# Altium schematic symbol library jlcpcb_2025_04_capacitors_extended_0402.schlib: 3594 symbols (part 9 of 20) (continued)
## CC0402KRX7R9BB332
designator C?  Capacitance: 3.3nF  (hidden comment: *)
Capacitor, Ceramic (MLCC), 3.3nF, ±10%, 50V, X7R, ±10%, SMD 0402; Manufacturer: YAGEO; Manufacturer Part Number: CC0402KRX7R9BB332; Package Size: 0402; JLCPCB Basic Part: No; JLCPCB Part Number: C107028; Supplier 1: LCSC; Category: Capacitors - MLCC; Supplier Part Number 1: C107028; Tolerance: ±10%; Voltage Rating: 50V; Temperature Coefficient: X7R; RoHS: Yes; ComponentLink1Description: Datasheet; ComponentLink1URL: https://wmsc.lcsc.com/wmsc/upload/file/pdf/v2/lcsc/2304140030_YAGEO-CC0402KRX7R9BB332_C107028.pdf; ComponentLink2Description: JLCPCB Part URL; ComponentLink2URL: https://jlcpcb.com/partdetail/C107028; ComponentLink3Description: LCSC Part URL; ComponentLink3URL: https://lcsc.com/product-detail/Multilayer-Ceramic-Capacitors-MLCC---SMD-SMT_YAGEO-YAGEO-CC0402KRX7R9BB332_C107028.html
footprint CAP-0402 (0402 (1005M) Capacitor)
pins: 1, 2

## CC0402KRX7R9BB333
designator C?  Capacitance: 33nF  (hidden comment: *)
Capacitor, Ceramic (MLCC), 33nF, ±10%, 50V, X7R, ±10%, SMD 0402; Manufacturer: YAGEO; Manufacturer Part Number: CC0402KRX7R9BB333; Package Size: 0402; JLCPCB Basic Part: No; JLCPCB Part Number: C106862; Supplier 1: LCSC; Category: Capacitors - MLCC; Supplier Part Number 1: C106862; Tolerance: ±10%; Voltage Rating: 50V; Temperature Coefficient: X7R; RoHS: Yes; ComponentLink1Description: Datasheet; ComponentLink1URL: https://wmsc.lcsc.com/wmsc/upload/file/pdf/v2/lcsc/2304140030_YAGEO-CC0402KRX7R9BB333_C106862.pdf; ComponentLink2Description: JLCPCB Part URL; ComponentLink2URL: https://jlcpcb.com/partdetail/C106862; ComponentLink3Description: LCSC Part URL; ComponentLink3URL: https://lcsc.com/product-detail/Multilayer-Ceramic-Capacitors-MLCC---SMD-SMT_YAGEO-YAGEO-CC0402KRX7R9BB333_C106862.html
footprint CAP-0402 (0402 (1005M) Capacitor)
pins: 1, 2

## CC0402KRX7R9BB391
designator C?  Capacitance: 390pF  (hidden comment: *)
Capacitor, Ceramic (MLCC), 390pF, ±10%, 50V, X7R, ±10%, SMD 0402; Manufacturer: YAGEO; Manufacturer Part Number: CC0402KRX7R9BB391; Package Size: 0402; JLCPCB Basic Part: No; JLCPCB Part Number: C114397; Supplier 1: LCSC; Category: Capacitors - MLCC; Supplier Part Number 1: C114397; Tolerance: ±10%; Voltage Rating: 50V; Temperature Coefficient: X7R; RoHS: Yes; ComponentLink1Description: Datasheet; ComponentLink1URL: https://wmsc.lcsc.com/wmsc/upload/file/pdf/v2/lcsc/2304140030_YAGEO-CC0402KRX7R9BB391_C114397.pdf; ComponentLink2Description: JLCPCB Part URL; ComponentLink2URL: https://jlcpcb.com/partdetail/C114397; ComponentLink3Description: LCSC Part URL; ComponentLink3URL: https://lcsc.com/product-detail/Multilayer-Ceramic-Capacitors-MLCC---SMD-SMT_YAGEO-YAGEO-CC0402KRX7R9BB391_C114397.html
footprint CAP-0402 (0402 (1005M) Capacitor)
pins: 1, 2

## CC0402KRX7R9BB392
designator C?  Capacitance: 3.9nF  (hidden comment: *)
Capacitor, Ceramic (MLCC), 3.9nF, ±10%, 50V, X7R, ±10%, SMD 0402; Manufacturer: YAGEO; Manufacturer Part Number: CC0402KRX7R9BB392; Package Size: 0402; JLCPCB Basic Part: No; JLCPCB Part Number: C113790; Supplier 1: LCSC; Category: Capacitors - MLCC; Supplier Part Number 1: C113790; Tolerance: ±10%; Voltage Rating: 50V; Temperature Coefficient: X7R; RoHS: Yes; ComponentLink1Description: Datasheet; ComponentLink1URL: https://wmsc.lcsc.com/wmsc/upload/file/pdf/v2/lcsc/2304140030_YAGEO-CC0402KRX7R9BB392_C113790.pdf; ComponentLink2Description: JLCPCB Part URL; ComponentLink2URL: https://jlcpcb.com/partdetail/C113790; ComponentLink3Description: LCSC Part URL; ComponentLink3URL: https://lcsc.com/product-detail/Multilayer-Ceramic-Capacitors-MLCC---SMD-SMT_YAGEO-YAGEO-CC0402KRX7R9BB392_C113790.html
footprint CAP-0402 (0402 (1005M) Capacitor)
pins: 1, 2

## CC0402KRX7R9BB471
designator C?  Capacitance: 470pF  (hidden comment: *)
Capacitor, Ceramic (MLCC), 470pF, ±10%, 50V, X7R, ±10%, SMD 0402; Manufacturer: YAGEO; Manufacturer Part Number: CC0402KRX7R9BB471; Package Size: 0402; JLCPCB Basic Part: No; JLCPCB Part Number: C106207; Supplier 1: LCSC; Category: Capacitors - MLCC; Supplier Part Number 1: C106207; Tolerance: ±10%; Voltage Rating: 50V; Temperature Coefficient: X7R; RoHS: Yes; ComponentLink1Description: Datasheet; ComponentLink1URL: https://wmsc.lcsc.com/wmsc/upload/file/pdf/v2/lcsc/2304140030_YAGEO-CC0402KRX7R9BB471_C106207.pdf; ComponentLink2Description: JLCPCB Part URL; ComponentLink2URL: https://jlcpcb.com/partdetail/C106207; ComponentLink3Description: LCSC Part URL; ComponentLink3URL: https://lcsc.com/product-detail/Multilayer-Ceramic-Capacitors-MLCC---SMD-SMT_YAGEO-YAGEO-CC0402KRX7R9BB471_C106207.html
footprint CAP-0402 (0402 (1005M) Capacitor)
pins: 1, 2

## CC0402KRX7R9BB472
designator C?  Capacitance: 4.7nF  (hidden comment: *)
Capacitor, Ceramic (MLCC), 4.7nF, ±10%, 50V, X7R, ±10%, SMD 0402; Manufacturer: YAGEO; Manufacturer Part Number: CC0402KRX7R9BB472; Package Size: 0402; JLCPCB Basic Part: No; JLCPCB Part Number: C106208; Supplier 1: LCSC; Category: Capacitors - MLCC; Supplier Part Number 1: C106208; Tolerance: ±10%; Voltage Rating: 50V; Temperature Coefficient: X7R; RoHS: Yes; ComponentLink1Description: Datasheet; ComponentLink1URL: https://wmsc.lcsc.com/wmsc/upload/file/pdf/v2/lcsc/2304140030_YAGEO-CC0402KRX7R9BB472_C106208.pdf; ComponentLink2Description: JLCPCB Part URL; ComponentLink2URL: https://jlcpcb.com/partdetail/C106208; ComponentLink3Description: LCSC Part URL; ComponentLink3URL: https://lcsc.com/product-detail/Multilayer-Ceramic-Capacitors-MLCC---SMD-SMT_YAGEO-YAGEO-CC0402KRX7R9BB472_C106208.html
footprint CAP-0402 (0402 (1005M) Capacitor)
pins: 1, 2

## CC0402KRX7R9BB473
designator C?  Capacitance: 47nF  (hidden comment: *)
Capacitor, Ceramic (MLCC), 47nF, ±10%, 50V, X7R, ±10%, SMD 0402; Manufacturer: YAGEO; Manufacturer Part Number: CC0402KRX7R9BB473; Package Size: 0402; JLCPCB Basic Part: No; JLCPCB Part Number: C272875; Supplier 1: LCSC; Category: Capacitors - MLCC; Supplier Part Number 1: C272875; Tolerance: ±10%; Voltage Rating: 50V; Temperature Coefficient: X7R; RoHS: Yes; ComponentLink1Description: Datasheet; ComponentLink1URL: https://wmsc.lcsc.com/wmsc/upload/file/pdf/v2/lcsc/2304140030_YAGEO-CC0402KRX7R9BB473_C272875.pdf; ComponentLink2Description: JLCPCB Part URL; ComponentLink2URL: https://jlcpcb.com/partdetail/C272875; ComponentLink3Description: LCSC Part URL; ComponentLink3URL: https://lcsc.com/product-detail/Multilayer-Ceramic-Capacitors-MLCC---SMD-SMT_YAGEO-YAGEO-CC0402KRX7R9BB473_C272875.html
footprint CAP-0402 (0402 (1005M) Capacitor)
pins: 1, 2

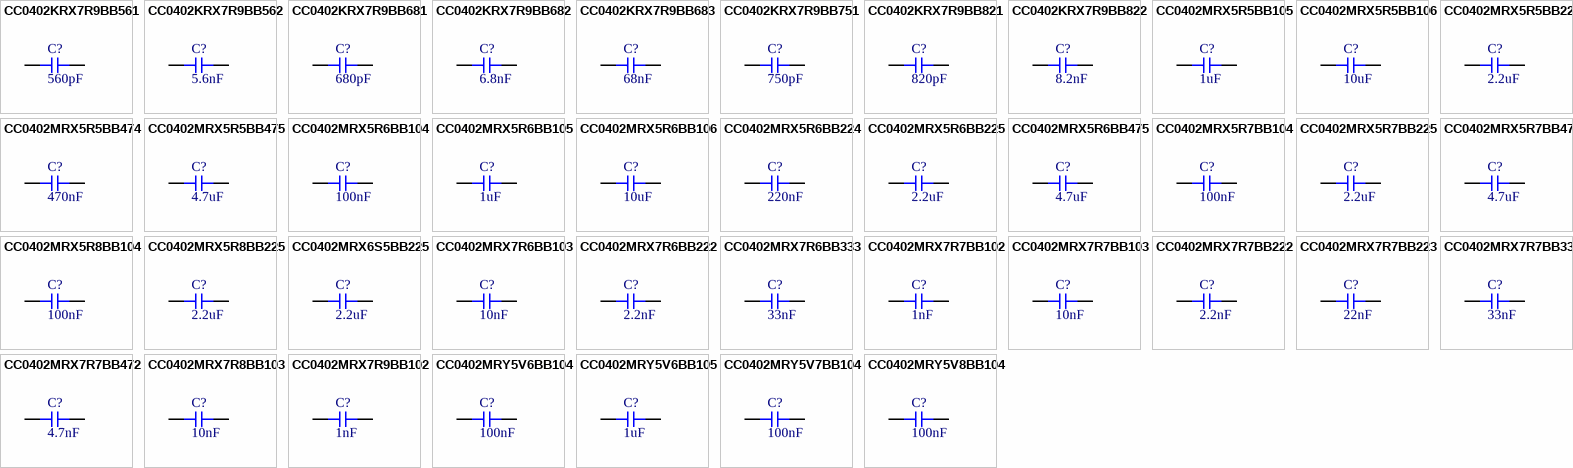
[diagram p41: symbols CC0402KRX7R9BB561 to CC0402MRY5V8BB104]

## CC0402KRX7R9BB561
designator C?  Capacitance: 560pF  (hidden comment: *)
Capacitor, Ceramic (MLCC), 560pF, ±10%, 50V, X7R, ±10%, SMD 0402; Manufacturer: YAGEO; Manufacturer Part Number: CC0402KRX7R9BB561; Package Size: 0402; JLCPCB Basic Part: No; JLCPCB Part Number: C107029; Supplier 1: LCSC; Category: Capacitors - MLCC; Supplier Part Number 1: C107029; Tolerance: ±10%; Voltage Rating: 50V; Temperature Coefficient: X7R; RoHS: Yes; ComponentLink1Description: Datasheet; ComponentLink1URL: https://wmsc.lcsc.com/wmsc/upload/file/pdf/v2/lcsc/2304140030_YAGEO-CC0402KRX7R9BB561_C107029.pdf; ComponentLink2Description: JLCPCB Part URL; ComponentLink2URL: https://jlcpcb.com/partdetail/C107029; ComponentLink3Description: LCSC Part URL; ComponentLink3URL: https://lcsc.com/product-detail/Multilayer-Ceramic-Capacitors-MLCC---SMD-SMT_YAGEO-YAGEO-CC0402KRX7R9BB561_C107029.html
footprint CAP-0402 (0402 (1005M) Capacitor)
pins: 1, 2

## CC0402KRX7R9BB562
designator C?  Capacitance: 5.6nF  (hidden comment: *)
Capacitor, Ceramic (MLCC), 5.6nF, ±10%, 50V, X7R, ±10%, SMD 0402; Manufacturer: YAGEO; Manufacturer Part Number: CC0402KRX7R9BB562; Package Size: 0402; JLCPCB Basic Part: No; JLCPCB Part Number: C281760; Supplier 1: LCSC; Category: Capacitors - MLCC; Supplier Part Number 1: C281760; Tolerance: ±10%; Voltage Rating: 50V; Temperature Coefficient: X7R; RoHS: Yes; ComponentLink1Description: Datasheet; ComponentLink1URL: https://wmsc.lcsc.com/wmsc/upload/file/pdf/v2/lcsc/2304140030_YAGEO-CC0402KRX7R9BB562_C281760.pdf; ComponentLink2Description: JLCPCB Part URL; ComponentLink2URL: https://jlcpcb.com/partdetail/C281760; ComponentLink3Description: LCSC Part URL; ComponentLink3URL: https://lcsc.com/product-detail/Multilayer-Ceramic-Capacitors-MLCC---SMD-SMT_YAGEO-YAGEO-CC0402KRX7R9BB562_C281760.html
footprint CAP-0402 (0402 (1005M) Capacitor)
pins: 1, 2

## CC0402KRX7R9BB681
designator C?  Capacitance: 680pF  (hidden comment: *)
Capacitor, Ceramic (MLCC), 680pF, ±10%, 50V, X7R, ±10%, SMD 0402; Manufacturer: YAGEO; Manufacturer Part Number: CC0402KRX7R9BB681; Package Size: 0402; JLCPCB Basic Part: No; JLCPCB Part Number: C107030; Supplier 1: LCSC; Category: Capacitors - MLCC; Supplier Part Number 1: C107030; Tolerance: ±10%; Voltage Rating: 50V; Temperature Coefficient: X7R; RoHS: Yes; ComponentLink1Description: Datasheet; ComponentLink1URL: https://wmsc.lcsc.com/wmsc/upload/file/pdf/v2/lcsc/2304140030_YAGEO-CC0402KRX7R9BB681_C107030.pdf; ComponentLink2Description: JLCPCB Part URL; ComponentLink2URL: https://jlcpcb.com/partdetail/C107030; ComponentLink3Description: LCSC Part URL; ComponentLink3URL: https://lcsc.com/product-detail/Multilayer-Ceramic-Capacitors-MLCC---SMD-SMT_YAGEO-YAGEO-CC0402KRX7R9BB681_C107030.html
footprint CAP-0402 (0402 (1005M) Capacitor)
pins: 1, 2

## CC0402KRX7R9BB682
designator C?  Capacitance: 6.8nF  (hidden comment: *)
Capacitor, Ceramic (MLCC), 6.8nF, ±10%, 50V, X7R, ±10%, SMD 0402; Manufacturer: YAGEO; Manufacturer Part Number: CC0402KRX7R9BB682; Package Size: 0402; JLCPCB Basic Part: No; JLCPCB Part Number: C93654; Supplier 1: LCSC; Category: Capacitors - MLCC; Supplier Part Number 1: C93654; Tolerance: ±10%; Voltage Rating: 50V; Temperature Coefficient: X7R; RoHS: Yes; ComponentLink1Description: Datasheet; ComponentLink1URL: https://wmsc.lcsc.com/wmsc/upload/file/pdf/v2/lcsc/2304140030_YAGEO-CC0402KRX7R9BB682_C93654.pdf; ComponentLink2Description: JLCPCB Part URL; ComponentLink2URL: https://jlcpcb.com/partdetail/C93654; ComponentLink3Description: LCSC Part URL; ComponentLink3URL: https://lcsc.com/product-detail/Multilayer-Ceramic-Capacitors-MLCC---SMD-SMT_YAGEO-YAGEO-CC0402KRX7R9BB682_C93654.html
footprint CAP-0402 (0402 (1005M) Capacitor)
pins: 1, 2

## CC0402KRX7R9BB683
designator C?  Capacitance: 68nF  (hidden comment: *)
Capacitor, Ceramic (MLCC), 68nF, ±10%, 50V, X7R, ±10%, SMD 0402; Manufacturer: YAGEO; Manufacturer Part Number: CC0402KRX7R9BB683; Package Size: 0402; JLCPCB Basic Part: No; JLCPCB Part Number: C354977; Supplier 1: LCSC; Category: Capacitors - MLCC; Supplier Part Number 1: C354977; Tolerance: ±10%; Voltage Rating: 50V; Temperature Coefficient: X7R; RoHS: Yes; ComponentLink1Description: Datasheet; ComponentLink1URL: https://wmsc.lcsc.com/wmsc/upload/file/pdf/v2/lcsc/2311211121_YAGEO-CC0402KRX7R9BB683_C354977.pdf; ComponentLink2Description: JLCPCB Part URL; ComponentLink2URL: https://jlcpcb.com/partdetail/C354977; ComponentLink3Description: LCSC Part URL; ComponentLink3URL: https://lcsc.com/product-detail/Multilayer-Ceramic-Capacitors-MLCC---SMD-SMT_YAGEO-YAGEO-CC0402KRX7R9BB683_C354977.html
footprint CAP-0402 (0402 (1005M) Capacitor)
pins: 1, 2

## CC0402KRX7R9BB751
designator C?  Capacitance: 750pF  (hidden comment: *)
Capacitor, Ceramic (MLCC), 750pF, ±10%, 50V, X7R, ±10%, SMD 0402; Manufacturer: YAGEO; Manufacturer Part Number: CC0402KRX7R9BB751; Package Size: 0402; JLCPCB Basic Part: No; JLCPCB Part Number: C513563; Supplier 1: LCSC; Category: Capacitors - MLCC; Supplier Part Number 1: C513563; Tolerance: ±10%; Voltage Rating: 50V; Temperature Coefficient: X7R; RoHS: Yes; ComponentLink1Description: Datasheet; ComponentLink1URL: https://wmsc.lcsc.com/wmsc/upload/file/pdf/v2/lcsc/2204291600_YAGEO-CC0402KRX7R9BB751_C513563.pdf; ComponentLink2Description: JLCPCB Part URL; ComponentLink2URL: https://jlcpcb.com/partdetail/C513563; ComponentLink3Description: LCSC Part URL; ComponentLink3URL: https://lcsc.com/product-detail/Multilayer-Ceramic-Capacitors-MLCC---SMD-SMT_YAGEO-YAGEO-CC0402KRX7R9BB751_C513563.html
footprint CAP-0402 (0402 (1005M) Capacitor)
pins: 1, 2

## CC0402KRX7R9BB821
designator C?  Capacitance: 820pF  (hidden comment: *)
Capacitor, Ceramic (MLCC), 820pF, ±10%, 50V, X7R, ±10%, SMD 0402; Manufacturer: YAGEO; Manufacturer Part Number: CC0402KRX7R9BB821; Package Size: 0402; JLCPCB Basic Part: No; JLCPCB Part Number: C107031; Supplier 1: LCSC; Category: Capacitors - MLCC; Supplier Part Number 1: C107031; Tolerance: ±10%; Voltage Rating: 50V; Temperature Coefficient: X7R; RoHS: Yes; ComponentLink1Description: Datasheet; ComponentLink1URL: https://wmsc.lcsc.com/wmsc/upload/file/pdf/v2/lcsc/2008031703_YAGEO-CC0402KRX7R9BB821_C107031.pdf; ComponentLink2Description: JLCPCB Part URL; ComponentLink2URL: https://jlcpcb.com/partdetail/C107031; ComponentLink3Description: LCSC Part URL; ComponentLink3URL: https://lcsc.com/product-detail/Multilayer-Ceramic-Capacitors-MLCC---SMD-SMT_YAGEO-YAGEO-CC0402KRX7R9BB821_C107031.html
footprint CAP-0402 (0402 (1005M) Capacitor)
pins: 1, 2

## CC0402KRX7R9BB822
designator C?  Capacitance: 8.2nF  (hidden comment: *)
Capacitor, Ceramic (MLCC), 8.2nF, ±10%, 50V, X7R, ±10%, SMD 0402; Manufacturer: YAGEO; Manufacturer Part Number: CC0402KRX7R9BB822; Package Size: 0402; JLCPCB Basic Part: No; JLCPCB Part Number: C107032; Supplier 1: LCSC; Category: Capacitors - MLCC; Supplier Part Number 1: C107032; Tolerance: ±10%; Voltage Rating: 50V; Temperature Coefficient: X7R; RoHS: Yes; ComponentLink1Description: Datasheet; ComponentLink1URL: https://wmsc.lcsc.com/wmsc/upload/file/pdf/v2/lcsc/2304140030_YAGEO-CC0402KRX7R9BB822_C107032.pdf; ComponentLink2Description: JLCPCB Part URL; ComponentLink2URL: https://jlcpcb.com/partdetail/C107032; ComponentLink3Description: LCSC Part URL; ComponentLink3URL: https://lcsc.com/product-detail/Multilayer-Ceramic-Capacitors-MLCC---SMD-SMT_YAGEO-YAGEO-CC0402KRX7R9BB822_C107032.html
footprint CAP-0402 (0402 (1005M) Capacitor)
pins: 1, 2

## CC0402MRX5R5BB105
designator C?  Capacitance: 1uF  (hidden comment: *)
Capacitor, Ceramic (MLCC), 1uF, ±20%, 6.3V, X5R, ±20%, SMD 0402; Manufacturer: YAGEO; Manufacturer Part Number: CC0402MRX5R5BB105; Package Size: 0402; JLCPCB Basic Part: No; JLCPCB Part Number: C541408; Supplier 1: LCSC; Category: Capacitors - MLCC; Supplier Part Number 1: C541408; Tolerance: ±20%; Voltage Rating: 6.3V; Temperature Coefficient: X5R; RoHS: Yes; ComponentLink1Description: Datasheet; ComponentLink1URL: https://wmsc.lcsc.com/wmsc/upload/file/pdf/v2/lcsc/2407081117_YAGEO-CC0402MRX5R5BB105_C541408.pdf; ComponentLink2Description: JLCPCB Part URL; ComponentLink2URL: https://jlcpcb.com/partdetail/C541408; ComponentLink3Description: LCSC Part URL; ComponentLink3URL: https://lcsc.com/product-detail/Multilayer-Ceramic-Capacitors-MLCC---SMD-SMT_YAGEO-YAGEO-CC0402MRX5R5BB105_C541408.html
footprint CAP-0402 (0402 (1005M) Capacitor)
pins: 1, 2

## CC0402MRX5R5BB106
designator C?  Capacitance: 10uF  (hidden comment: *)
Capacitor, Ceramic (MLCC), 10uF, ±20%, 6.3V, X5R, ±20%, SMD 0402; Manufacturer: YAGEO; Manufacturer Part Number: CC0402MRX5R5BB106; Package Size: 0402; JLCPCB Basic Part: No; JLCPCB Part Number: C105884; Supplier 1: LCSC; Category: Capacitors - MLCC; Supplier Part Number 1: C105884; Tolerance: ±20%; Voltage Rating: 6.3V; Temperature Coefficient: X5R; RoHS: Yes; ComponentLink1Description: Datasheet; ComponentLink1URL: https://wmsc.lcsc.com/wmsc/upload/file/pdf/v2/lcsc/2407081117_YAGEO-CC0402MRX5R5BB106_C105884.pdf; ComponentLink2Description: JLCPCB Part URL; ComponentLink2URL: https://jlcpcb.com/partdetail/C105884; ComponentLink3Description: LCSC Part URL; ComponentLink3URL: https://lcsc.com/product-detail/Multilayer-Ceramic-Capacitors-MLCC---SMD-SMT_YAGEO-YAGEO-CC0402MRX5R5BB106_C105884.html
footprint CAP-0402 (0402 (1005M) Capacitor)
pins: 1, 2

## CC0402MRX5R5BB225
designator C?  Capacitance: 2.2uF  (hidden comment: *)
Capacitor, Ceramic (MLCC), 2.2uF, ±20%, 6.3V, X5R, ±20%, SMD 0402; Manufacturer: YAGEO; Manufacturer Part Number: CC0402MRX5R5BB225; Package Size: 0402; JLCPCB Basic Part: No; JLCPCB Part Number: C106860; Supplier 1: LCSC; Category: Capacitors - MLCC; Supplier Part Number 1: C106860; Tolerance: ±20%; Voltage Rating: 6.3V; Temperature Coefficient: X5R; RoHS: Yes; ComponentLink1Description: Datasheet; ComponentLink1URL: https://wmsc.lcsc.com/wmsc/upload/file/pdf/v2/lcsc/2407081117_YAGEO-CC0402MRX5R5BB225_C106860.pdf; ComponentLink2Description: JLCPCB Part URL; ComponentLink2URL: https://jlcpcb.com/partdetail/C106860; ComponentLink3Description: LCSC Part URL; ComponentLink3URL: https://lcsc.com/product-detail/Multilayer-Ceramic-Capacitors-MLCC---SMD-SMT_YAGEO-YAGEO-CC0402MRX5R5BB225_C106860.html
footprint CAP-0402 (0402 (1005M) Capacitor)
pins: 1, 2

## CC0402MRX5R5BB474
designator C?  Capacitance: 470nF  (hidden comment: *)
Capacitor, Ceramic (MLCC), 470nF, ±20%, 6.3V, X5R, ±20%, SMD 0402; Manufacturer: YAGEO; Manufacturer Part Number: CC0402MRX5R5BB474; Package Size: 0402; JLCPCB Basic Part: No; JLCPCB Part Number: C469626; Supplier 1: LCSC; Category: Capacitors - MLCC; Supplier Part Number 1: C469626; Tolerance: ±20%; Voltage Rating: 6.3V; Temperature Coefficient: X5R; RoHS: Yes; ComponentLink1Description: Datasheet; ComponentLink1URL: https://wmsc.lcsc.com/wmsc/upload/file/pdf/v2/lcsc/2407081117_YAGEO-CC0402MRX5R5BB474_C469626.pdf; ComponentLink2Description: JLCPCB Part URL; ComponentLink2URL: https://jlcpcb.com/partdetail/C469626; ComponentLink3Description: LCSC Part URL; ComponentLink3URL: https://lcsc.com/product-detail/Multilayer-Ceramic-Capacitors-MLCC---SMD-SMT_YAGEO-YAGEO-CC0402MRX5R5BB474_C469626.html
footprint CAP-0402 (0402 (1005M) Capacitor)
pins: 1, 2

## CC0402MRX5R5BB475
designator C?  Capacitance: 4.7uF  (hidden comment: *)
Capacitor, Ceramic (MLCC), 4.7uF, ±20%, 6.3V, X5R, ±20%, SMD 0402; Manufacturer: YAGEO; Manufacturer Part Number: CC0402MRX5R5BB475; Package Size: 0402; JLCPCB Basic Part: No; JLCPCB Part Number: C106859; Supplier 1: LCSC; Category: Capacitors - MLCC; Supplier Part Number 1: C106859; Tolerance: ±20%; Voltage Rating: 6.3V; Temperature Coefficient: X5R; RoHS: Yes; ComponentLink1Description: Datasheet; ComponentLink1URL: https://wmsc.lcsc.com/wmsc/upload/file/pdf/v2/lcsc/2407081117_YAGEO-CC0402MRX5R5BB475_C106859.pdf; ComponentLink2Description: JLCPCB Part URL; ComponentLink2URL: https://jlcpcb.com/partdetail/C106859; ComponentLink3Description: LCSC Part URL; ComponentLink3URL: https://lcsc.com/product-detail/Multilayer-Ceramic-Capacitors-MLCC---SMD-SMT_YAGEO-YAGEO-CC0402MRX5R5BB475_C106859.html
footprint CAP-0402 (0402 (1005M) Capacitor)
pins: 1, 2

## CC0402MRX5R6BB104
designator C?  Capacitance: 100nF  (hidden comment: *)
Capacitor, Ceramic (MLCC), 100nF, ±20%, 10V, X5R, ±20%, SMD 0402; Manufacturer: YAGEO; Manufacturer Part Number: CC0402MRX5R6BB104; Package Size: 0402; JLCPCB Basic Part: No; JLCPCB Part Number: C2171572; Supplier 1: LCSC; Category: Capacitors - MLCC; Supplier Part Number 1: C2171572; Tolerance: ±20%; Voltage Rating: 10V; Temperature Coefficient: X5R; RoHS: Yes; ComponentLink1Description: Datasheet; ComponentLink1URL: https://wmsc.lcsc.com/wmsc/upload/file/pdf/v2/lcsc/2407081117_YAGEO-CC0402MRX5R6BB104_C2171572.pdf; ComponentLink2Description: JLCPCB Part URL; ComponentLink2URL: https://jlcpcb.com/partdetail/C2171572; ComponentLink3Description: LCSC Part URL; ComponentLink3URL: https://lcsc.com/product-detail/Multilayer-Ceramic-Capacitors-MLCC---SMD-SMT_YAGEO-YAGEO-CC0402MRX5R6BB104_C2171572.html
footprint CAP-0402 (0402 (1005M) Capacitor)
pins: 1, 2

## CC0402MRX5R6BB105
designator C?  Capacitance: 1uF  (hidden comment: *)
Capacitor, Ceramic (MLCC), 1uF, ±20%, 10V, X5R, ±20%, SMD 0402; Manufacturer: YAGEO; Manufacturer Part Number: CC0402MRX5R6BB105; Package Size: 0402; JLCPCB Basic Part: No; JLCPCB Part Number: C113791; Supplier 1: LCSC; Category: Capacitors - MLCC; Supplier Part Number 1: C113791; Tolerance: ±20%; Voltage Rating: 10V; Temperature Coefficient: X5R; RoHS: Yes; ComponentLink1Description: Datasheet; ComponentLink1URL: https://wmsc.lcsc.com/wmsc/upload/file/pdf/v2/lcsc/2407081117_YAGEO-CC0402MRX5R6BB105_C113791.pdf; ComponentLink2Description: JLCPCB Part URL; ComponentLink2URL: https://jlcpcb.com/partdetail/C113791; ComponentLink3Description: LCSC Part URL; ComponentLink3URL: https://lcsc.com/product-detail/Multilayer-Ceramic-Capacitors-MLCC---SMD-SMT_YAGEO-YAGEO-CC0402MRX5R6BB105_C113791.html
footprint CAP-0402 (0402 (1005M) Capacitor)
pins: 1, 2

## CC0402MRX5R6BB106
designator C?  Capacitance: 10uF  (hidden comment: *)
Capacitor, Ceramic (MLCC), 10uF, ±20%, 10V, X5R, ±20%, SMD 0402; Manufacturer: YAGEO; Manufacturer Part Number: CC0402MRX5R6BB106; Package Size: 0402; JLCPCB Basic Part: No; JLCPCB Part Number: C962143; Supplier 1: LCSC; Category: Capacitors - MLCC; Supplier Part Number 1: C962143; Tolerance: ±20%; Voltage Rating: 10V; Temperature Coefficient: X5R; RoHS: Yes; ComponentLink1Description: Datasheet; ComponentLink1URL: https://wmsc.lcsc.com/wmsc/upload/file/pdf/v2/lcsc/2407081117_YAGEO-CC0402MRX5R6BB106_C962143.pdf; ComponentLink2Description: JLCPCB Part URL; ComponentLink2URL: https://jlcpcb.com/partdetail/C962143; ComponentLink3Description: LCSC Part URL; ComponentLink3URL: https://lcsc.com/product-detail/Multilayer-Ceramic-Capacitors-MLCC---SMD-SMT_YAGEO-YAGEO-CC0402MRX5R6BB106_C962143.html
footprint CAP-0402 (0402 (1005M) Capacitor)
pins: 1, 2

## CC0402MRX5R6BB224
designator C?  Capacitance: 220nF  (hidden comment: *)
Capacitor, Ceramic (MLCC), 220nF, ±20%, 10V, X5R, ±20%, SMD 0402; Manufacturer: YAGEO; Manufacturer Part Number: CC0402MRX5R6BB224; Package Size: 0402; JLCPCB Basic Part: No; JLCPCB Part Number: C2188682; Supplier 1: LCSC; Category: Capacitors - MLCC; Supplier Part Number 1: C2188682; Tolerance: ±20%; Voltage Rating: 10V; Temperature Coefficient: X5R; RoHS: Yes; ComponentLink1Description: Datasheet; ComponentLink1URL: https://wmsc.lcsc.com/wmsc/upload/file/pdf/v2/lcsc/2407081117_YAGEO-CC0402MRX5R6BB224_C2188682.pdf; ComponentLink2Description: JLCPCB Part URL; ComponentLink2URL: https://jlcpcb.com/partdetail/C2188682; ComponentLink3Description: LCSC Part URL; ComponentLink3URL: https://lcsc.com/product-detail/Multilayer-Ceramic-Capacitors-MLCC---SMD-SMT_YAGEO-YAGEO-CC0402MRX5R6BB224_C2188682.html
footprint CAP-0402 (0402 (1005M) Capacitor)
pins: 1, 2

## CC0402MRX5R6BB225
designator C?  Capacitance: 2.2uF  (hidden comment: *)
Capacitor, Ceramic (MLCC), 2.2uF, ±20%, 10V, X5R, ±20%, SMD 0402; Manufacturer: YAGEO; Manufacturer Part Number: CC0402MRX5R6BB225; Package Size: 0402; JLCPCB Basic Part: No; JLCPCB Part Number: C541410; Supplier 1: LCSC; Category: Capacitors - MLCC; Supplier Part Number 1: C541410; Tolerance: ±20%; Voltage Rating: 10V; Temperature Coefficient: X5R; RoHS: Yes; ComponentLink1Description: Datasheet; ComponentLink1URL: https://wmsc.lcsc.com/wmsc/upload/file/pdf/v2/lcsc/2407081117_YAGEO-CC0402MRX5R6BB225_C541410.pdf; ComponentLink2Description: JLCPCB Part URL; ComponentLink2URL: https://jlcpcb.com/partdetail/C541410; ComponentLink3Description: LCSC Part URL; ComponentLink3URL: https://lcsc.com/product-detail/Multilayer-Ceramic-Capacitors-MLCC---SMD-SMT_YAGEO-YAGEO-CC0402MRX5R6BB225_C541410.html
footprint CAP-0402 (0402 (1005M) Capacitor)
pins: 1, 2

## CC0402MRX5R6BB475
designator C?  Capacitance: 4.7uF  (hidden comment: *)
Capacitor, Ceramic (MLCC), 4.7uF, ±20%, 10V, X5R, ±20%, SMD 0402; Manufacturer: YAGEO; Manufacturer Part Number: CC0402MRX5R6BB475; Package Size: 0402; JLCPCB Basic Part: No; JLCPCB Part Number: C469468; Supplier 1: LCSC; Category: Capacitors - MLCC; Supplier Part Number 1: C469468; Tolerance: ±20%; Voltage Rating: 10V; Temperature Coefficient: X5R; RoHS: Yes; ComponentLink1Description: Datasheet; ComponentLink1URL: https://wmsc.lcsc.com/wmsc/upload/file/pdf/v2/lcsc/2407081117_YAGEO-CC0402MRX5R6BB475_C469468.pdf; ComponentLink2Description: JLCPCB Part URL; ComponentLink2URL: https://jlcpcb.com/partdetail/C469468; ComponentLink3Description: LCSC Part URL; ComponentLink3URL: https://lcsc.com/product-detail/Multilayer-Ceramic-Capacitors-MLCC---SMD-SMT_YAGEO-YAGEO-CC0402MRX5R6BB475_C469468.html
footprint CAP-0402 (0402 (1005M) Capacitor)
pins: 1, 2

## CC0402MRX5R7BB104
designator C?  Capacitance: 100nF  (hidden comment: *)
Capacitor, Ceramic (MLCC), 100nF, ±20%, 16V, X5R, ±20%, SMD 0402; Manufacturer: YAGEO; Manufacturer Part Number: CC0402MRX5R7BB104; Package Size: 0402; JLCPCB Basic Part: No; JLCPCB Part Number: C576741; Supplier 1: LCSC; Category: Capacitors - MLCC; Supplier Part Number 1: C576741; Tolerance: ±20%; Voltage Rating: 16V; Temperature Coefficient: X5R; RoHS: Yes; ComponentLink1Description: Datasheet; ComponentLink1URL: https://wmsc.lcsc.com/wmsc/upload/file/pdf/v2/lcsc/2407081117_YAGEO-CC0402MRX5R7BB104_C576741.pdf; ComponentLink2Description: JLCPCB Part URL; ComponentLink2URL: https://jlcpcb.com/partdetail/C576741; ComponentLink3Description: LCSC Part URL; ComponentLink3URL: https://lcsc.com/product-detail/Multilayer-Ceramic-Capacitors-MLCC---SMD-SMT_YAGEO-YAGEO-CC0402MRX5R7BB104_C576741.html
footprint CAP-0402 (0402 (1005M) Capacitor)
pins: 1, 2

## CC0402MRX5R7BB225
designator C?  Capacitance: 2.2uF  (hidden comment: *)
Capacitor, Ceramic (MLCC), 2.2uF, ±20%, 16V, X5R, ±20%, SMD 0402; Manufacturer: YAGEO; Manufacturer Part Number: CC0402MRX5R7BB225; Package Size: 0402; JLCPCB Basic Part: No; JLCPCB Part Number: C2176814; Supplier 1: LCSC; Category: Capacitors - MLCC; Supplier Part Number 1: C2176814; Tolerance: ±20%; Voltage Rating: 16V; Temperature Coefficient: X5R; RoHS: Yes; ComponentLink1Description: Datasheet; ComponentLink1URL: https://wmsc.lcsc.com/wmsc/upload/file/pdf/v2/lcsc/2407081117_YAGEO-CC0402MRX5R7BB225_C2176814.pdf; ComponentLink2Description: JLCPCB Part URL; ComponentLink2URL: https://jlcpcb.com/partdetail/C2176814; ComponentLink3Description: LCSC Part URL; ComponentLink3URL: https://lcsc.com/product-detail/Multilayer-Ceramic-Capacitors-MLCC---SMD-SMT_YAGEO-YAGEO-CC0402MRX5R7BB225_C2176814.html
footprint CAP-0402 (0402 (1005M) Capacitor)
pins: 1, 2

## CC0402MRX5R7BB475
designator C?  Capacitance: 4.7uF  (hidden comment: *)
Capacitor, Ceramic (MLCC), 4.7uF, ±20%, 16V, X5R, ±20%, SMD 0402; Manufacturer: YAGEO; Manufacturer Part Number: CC0402MRX5R7BB475; Package Size: 0402; JLCPCB Basic Part: No; JLCPCB Part Number: C723999; Supplier 1: LCSC; Category: Capacitors - MLCC; Supplier Part Number 1: C723999; Tolerance: ±20%; Voltage Rating: 16V; Temperature Coefficient: X5R; RoHS: Yes; ComponentLink1Description: Datasheet; ComponentLink1URL: https://wmsc.lcsc.com/wmsc/upload/file/pdf/v2/lcsc/2407081117_YAGEO-CC0402MRX5R7BB475_C723999.pdf; ComponentLink2Description: JLCPCB Part URL; ComponentLink2URL: https://jlcpcb.com/partdetail/C723999; ComponentLink3Description: LCSC Part URL; ComponentLink3URL: https://lcsc.com/product-detail/Multilayer-Ceramic-Capacitors-MLCC---SMD-SMT_YAGEO-YAGEO-CC0402MRX5R7BB475_C723999.html
footprint CAP-0402 (0402 (1005M) Capacitor)
pins: 1, 2

## CC0402MRX5R8BB104
designator C?  Capacitance: 100nF  (hidden comment: *)
Capacitor, Ceramic (MLCC), 100nF, ±20%, 25V, X5R, ±20%, SMD 0402; Manufacturer: YAGEO; Manufacturer Part Number: CC0402MRX5R8BB104; Package Size: 0402; JLCPCB Basic Part: No; JLCPCB Part Number: C576743; Supplier 1: LCSC; Category: Capacitors - MLCC; Supplier Part Number 1: C576743; Tolerance: ±20%; Voltage Rating: 25V; Temperature Coefficient: X5R; RoHS: Yes; ComponentLink1Description: Datasheet; ComponentLink1URL: https://wmsc.lcsc.com/wmsc/upload/file/pdf/v2/lcsc/2407081117_YAGEO-CC0402MRX5R8BB104_C576743.pdf; ComponentLink2Description: JLCPCB Part URL; ComponentLink2URL: https://jlcpcb.com/partdetail/C576743; ComponentLink3Description: LCSC Part URL; ComponentLink3URL: https://lcsc.com/product-detail/Multilayer-Ceramic-Capacitors-MLCC---SMD-SMT_YAGEO-YAGEO-CC0402MRX5R8BB104_C576743.html
footprint CAP-0402 (0402 (1005M) Capacitor)
pins: 1, 2

## CC0402MRX5R8BB225
designator C?  Capacitance: 2.2uF  (hidden comment: *)
Capacitor, Ceramic (MLCC), 2.2uF, ±20%, 25V, X5R, ±20%, SMD 0402; Manufacturer: YAGEO; Manufacturer Part Number: CC0402MRX5R8BB225; Package Size: 0402; JLCPCB Basic Part: No; JLCPCB Part Number: C2178868; Supplier 1: LCSC; Category: Capacitors - MLCC; Supplier Part Number 1: C2178868; Tolerance: ±20%; Voltage Rating: 25V; Temperature Coefficient: X5R; RoHS: Yes; ComponentLink1Description: Datasheet; ComponentLink1URL: https://wmsc.lcsc.com/wmsc/upload/file/pdf/v2/lcsc/2407081117_YAGEO-CC0402MRX5R8BB225_C2178868.pdf; ComponentLink2Description: JLCPCB Part URL; ComponentLink2URL: https://jlcpcb.com/partdetail/C2178868; ComponentLink3Description: LCSC Part URL; ComponentLink3URL: https://lcsc.com/product-detail/Multilayer-Ceramic-Capacitors-MLCC---SMD-SMT_YAGEO-YAGEO-CC0402MRX5R8BB225_C2178868.html
footprint CAP-0402 (0402 (1005M) Capacitor)
pins: 1, 2

## CC0402MRX6S5BB225
designator C?  Capacitance: 2.2uF  (hidden comment: *)
Capacitor, Ceramic (MLCC), 2.2uF, ±20%, 6.3V, X6S, ±20%, SMD 0402; Manufacturer: YAGEO; Manufacturer Part Number: CC0402MRX6S5BB225; Package Size: 0402; JLCPCB Basic Part: No; JLCPCB Part Number: C3889086; Supplier 1: LCSC; Category: Capacitors - MLCC; Supplier Part Number 1: C3889086; Tolerance: ±20%; Voltage Rating: 6.3V; Temperature Coefficient: X6S; RoHS: Yes; ComponentLink1Description: Datasheet; ComponentLink1URL: https://wmsc.lcsc.com/wmsc/upload/file/pdf/v2/lcsc/2311211121_YAGEO-CC0402MRX6S5BB225_C3889086.pdf; ComponentLink2Description: JLCPCB Part URL; ComponentLink2URL: https://jlcpcb.com/partdetail/C3889086; ComponentLink3Description: LCSC Part URL; ComponentLink3URL: https://lcsc.com/product-detail/Multilayer-Ceramic-Capacitors-MLCC---SMD-SMT_YAGEO-YAGEO-CC0402MRX6S5BB225_C3889086.html
footprint CAP-0402 (0402 (1005M) Capacitor)
pins: 1, 2

## CC0402MRX7R6BB103
designator C?  Capacitance: 10nF  (hidden comment: *)
Capacitor, Ceramic (MLCC), 10nF, ±20%, 10V, X7R, ±20%, SMD 0402; Manufacturer: YAGEO; Manufacturer Part Number: CC0402MRX7R6BB103; Package Size: 0402; JLCPCB Basic Part: No; JLCPCB Part Number: C527020; Supplier 1: LCSC; Category: Capacitors - MLCC; Supplier Part Number 1: C527020; Tolerance: ±20%; Voltage Rating: 10V; Temperature Coefficient: X7R; RoHS: Yes; ComponentLink1Description: Datasheet; ComponentLink1URL: https://wmsc.lcsc.com/wmsc/upload/file/pdf/v2/lcsc/2005262134_YAGEO-CC0402MRX7R6BB103_C527020.pdf; ComponentLink2Description: JLCPCB Part URL; ComponentLink2URL: https://jlcpcb.com/partdetail/C527020; ComponentLink3Description: LCSC Part URL; ComponentLink3URL: https://lcsc.com/product-detail/Multilayer-Ceramic-Capacitors-MLCC---SMD-SMT_YAGEO-YAGEO-CC0402MRX7R6BB103_C527020.html
footprint CAP-0402 (0402 (1005M) Capacitor)
pins: 1, 2

## CC0402MRX7R6BB222
designator C?  Capacitance: 2.2nF  (hidden comment: *)
Capacitor, Ceramic (MLCC), 2.2nF, ±20%, 10V, X7R, ±20%, SMD 0402; Manufacturer: YAGEO; Manufacturer Part Number: CC0402MRX7R6BB222; Package Size: 0402; JLCPCB Basic Part: No; JLCPCB Part Number: C527021; Supplier 1: LCSC; Category: Capacitors - MLCC; Supplier Part Number 1: C527021; Tolerance: ±20%; Voltage Rating: 10V; Temperature Coefficient: X7R; RoHS: Yes; ComponentLink1Description: Datasheet; ComponentLink1URL: https://wmsc.lcsc.com/wmsc/upload/file/pdf/v2/lcsc/2006031835_YAGEO-CC0402MRX7R6BB222_C527021.pdf; ComponentLink2Description: JLCPCB Part URL; ComponentLink2URL: https://jlcpcb.com/partdetail/C527021; ComponentLink3Description: LCSC Part URL; ComponentLink3URL: https://lcsc.com/product-detail/Multilayer-Ceramic-Capacitors-MLCC---SMD-SMT_YAGEO-YAGEO-CC0402MRX7R6BB222_C527021.html
footprint CAP-0402 (0402 (1005M) Capacitor)
pins: 1, 2

## CC0402MRX7R6BB333
designator C?  Capacitance: 33nF  (hidden comment: *)
Capacitor, Ceramic (MLCC), 33nF, ±20%, 10V, X7R, ±20%, SMD 0402; Manufacturer: YAGEO; Manufacturer Part Number: CC0402MRX7R6BB333; Package Size: 0402; JLCPCB Basic Part: No; JLCPCB Part Number: C527022; Supplier 1: LCSC; Category: Capacitors - MLCC; Supplier Part Number 1: C527022; Tolerance: ±20%; Voltage Rating: 10V; Temperature Coefficient: X7R; RoHS: Yes; ComponentLink1Description: Datasheet; ComponentLink1URL: https://wmsc.lcsc.com/wmsc/upload/file/pdf/v2/lcsc/2006181534_YAGEO-CC0402MRX7R6BB333_C527022.pdf; ComponentLink2Description: JLCPCB Part URL; ComponentLink2URL: https://jlcpcb.com/partdetail/C527022; ComponentLink3Description: LCSC Part URL; ComponentLink3URL: https://lcsc.com/product-detail/Multilayer-Ceramic-Capacitors-MLCC---SMD-SMT_YAGEO-YAGEO-CC0402MRX7R6BB333_C527022.html
footprint CAP-0402 (0402 (1005M) Capacitor)
pins: 1, 2

## CC0402MRX7R7BB102
designator C?  Capacitance: 1nF  (hidden comment: *)
Capacitor, Ceramic (MLCC), 1nF, ±20%, 16V, X7R, ±20%, SMD 0402; Manufacturer: YAGEO; Manufacturer Part Number: CC0402MRX7R7BB102; Package Size: 0402; JLCPCB Basic Part: No; JLCPCB Part Number: C527023; Supplier 1: LCSC; Category: Capacitors - MLCC; Supplier Part Number 1: C527023; Tolerance: ±20%; Voltage Rating: 16V; Temperature Coefficient: X7R; RoHS: Yes; ComponentLink1Description: Datasheet; ComponentLink1URL: https://wmsc.lcsc.com/wmsc/upload/file/pdf/v2/lcsc/2005261832_YAGEO-CC0402MRX7R7BB102_C527023.pdf; ComponentLink2Description: JLCPCB Part URL; ComponentLink2URL: https://jlcpcb.com/partdetail/C527023; ComponentLink3Description: LCSC Part URL; ComponentLink3URL: https://lcsc.com/product-detail/Multilayer-Ceramic-Capacitors-MLCC---SMD-SMT_YAGEO-YAGEO-CC0402MRX7R7BB102_C527023.html
footprint CAP-0402 (0402 (1005M) Capacitor)
pins: 1, 2

## CC0402MRX7R7BB103
designator C?  Capacitance: 10nF  (hidden comment: *)
Capacitor, Ceramic (MLCC), 10nF, ±20%, 16V, X7R, ±20%, SMD 0402; Manufacturer: YAGEO; Manufacturer Part Number: CC0402MRX7R7BB103; Package Size: 0402; JLCPCB Basic Part: No; JLCPCB Part Number: C527024; Supplier 1: LCSC; Category: Capacitors - MLCC; Supplier Part Number 1: C527024; Tolerance: ±20%; Voltage Rating: 16V; Temperature Coefficient: X7R; RoHS: Yes; ComponentLink1Description: Datasheet; ComponentLink1URL: https://wmsc.lcsc.com/wmsc/upload/file/pdf/v2/lcsc/2006031835_YAGEO-CC0402MRX7R7BB103_C527024.pdf; ComponentLink2Description: JLCPCB Part URL; ComponentLink2URL: https://jlcpcb.com/partdetail/C527024; ComponentLink3Description: LCSC Part URL; ComponentLink3URL: https://lcsc.com/product-detail/Multilayer-Ceramic-Capacitors-MLCC---SMD-SMT_YAGEO-YAGEO-CC0402MRX7R7BB103_C527024.html
footprint CAP-0402 (0402 (1005M) Capacitor)
pins: 1, 2

## CC0402MRX7R7BB222
designator C?  Capacitance: 2.2nF  (hidden comment: *)
Capacitor, Ceramic (MLCC), 2.2nF, ±20%, 16V, X7R, ±20%, SMD 0402; Manufacturer: YAGEO; Manufacturer Part Number: CC0402MRX7R7BB222; Package Size: 0402; JLCPCB Basic Part: No; JLCPCB Part Number: C527025; Supplier 1: LCSC; Category: Capacitors - MLCC; Supplier Part Number 1: C527025; Tolerance: ±20%; Voltage Rating: 16V; Temperature Coefficient: X7R; RoHS: Yes; ComponentLink1Description: Datasheet; ComponentLink1URL: https://wmsc.lcsc.com/wmsc/upload/file/pdf/v2/lcsc/2005261832_YAGEO-CC0402MRX7R7BB222_C527025.pdf; ComponentLink2Description: JLCPCB Part URL; ComponentLink2URL: https://jlcpcb.com/partdetail/C527025; ComponentLink3Description: LCSC Part URL; ComponentLink3URL: https://lcsc.com/product-detail/Multilayer-Ceramic-Capacitors-MLCC---SMD-SMT_YAGEO-YAGEO-CC0402MRX7R7BB222_C527025.html
footprint CAP-0402 (0402 (1005M) Capacitor)
pins: 1, 2

## CC0402MRX7R7BB223
designator C?  Capacitance: 22nF  (hidden comment: *)
Capacitor, Ceramic (MLCC), 22nF, ±20%, 16V, X7R, ±20%, SMD 0402; Manufacturer: YAGEO; Manufacturer Part Number: CC0402MRX7R7BB223; Package Size: 0402; JLCPCB Basic Part: No; JLCPCB Part Number: C527026; Supplier 1: LCSC; Category: Capacitors - MLCC; Supplier Part Number 1: C527026; Tolerance: ±20%; Voltage Rating: 16V; Temperature Coefficient: X7R; RoHS: Yes; ComponentLink1Description: Datasheet; ComponentLink1URL: https://wmsc.lcsc.com/wmsc/upload/file/pdf/v2/lcsc/2005261832_YAGEO-CC0402MRX7R7BB223_C527026.pdf; ComponentLink2Description: JLCPCB Part URL; ComponentLink2URL: https://jlcpcb.com/partdetail/C527026; ComponentLink3Description: LCSC Part URL; ComponentLink3URL: https://lcsc.com/product-detail/Multilayer-Ceramic-Capacitors-MLCC---SMD-SMT_YAGEO-YAGEO-CC0402MRX7R7BB223_C527026.html
footprint CAP-0402 (0402 (1005M) Capacitor)
pins: 1, 2

## CC0402MRX7R7BB333
designator C?  Capacitance: 33nF  (hidden comment: *)
Capacitor, Ceramic (MLCC), 33nF, ±20%, 16V, X7R, ±20%, SMD 0402; Manufacturer: YAGEO; Manufacturer Part Number: CC0402MRX7R7BB333; Package Size: 0402; JLCPCB Basic Part: No; JLCPCB Part Number: C527027; Supplier 1: LCSC; Category: Capacitors - MLCC; Supplier Part Number 1: C527027; Tolerance: ±20%; Voltage Rating: 16V; Temperature Coefficient: X7R; RoHS: Yes; ComponentLink1Description: Datasheet; ComponentLink1URL: https://wmsc.lcsc.com/wmsc/upload/file/pdf/v2/lcsc/2007171236_YAGEO-CC0402MRX7R7BB333_C527027.pdf; ComponentLink2Description: JLCPCB Part URL; ComponentLink2URL: https://jlcpcb.com/partdetail/C527027; ComponentLink3Description: LCSC Part URL; ComponentLink3URL: https://lcsc.com/product-detail/Multilayer-Ceramic-Capacitors-MLCC---SMD-SMT_YAGEO-YAGEO-CC0402MRX7R7BB333_C527027.html
footprint CAP-0402 (0402 (1005M) Capacitor)
pins: 1, 2

## CC0402MRX7R7BB472
designator C?  Capacitance: 4.7nF  (hidden comment: *)
Capacitor, Ceramic (MLCC), 4.7nF, ±20%, 16V, X7R, ±20%, SMD 0402; Manufacturer: YAGEO; Manufacturer Part Number: CC0402MRX7R7BB472; Package Size: 0402; JLCPCB Basic Part: No; JLCPCB Part Number: C527028; Supplier 1: LCSC; Category: Capacitors - MLCC; Supplier Part Number 1: C527028; Tolerance: ±20%; Voltage Rating: 16V; Temperature Coefficient: X7R; RoHS: Yes; ComponentLink1Description: Datasheet; ComponentLink1URL: https://wmsc.lcsc.com/wmsc/upload/file/pdf/v2/lcsc/2007021836_YAGEO-CC0402MRX7R7BB472_C527028.pdf; ComponentLink2Description: JLCPCB Part URL; ComponentLink2URL: https://jlcpcb.com/partdetail/C527028; ComponentLink3Description: LCSC Part URL; ComponentLink3URL: https://lcsc.com/product-detail/Multilayer-Ceramic-Capacitors-MLCC---SMD-SMT_YAGEO-YAGEO-CC0402MRX7R7BB472_C527028.html
footprint CAP-0402 (0402 (1005M) Capacitor)
pins: 1, 2

## CC0402MRX7R8BB103
designator C?  Capacitance: 10nF  (hidden comment: *)
Capacitor, Ceramic (MLCC), 10nF, ±20%, 25V, X7R, ±20%, SMD 0402; Manufacturer: YAGEO; Manufacturer Part Number: CC0402MRX7R8BB103; Package Size: 0402; JLCPCB Basic Part: No; JLCPCB Part Number: C1852860; Supplier 1: LCSC; Category: Capacitors - MLCC; Supplier Part Number 1: C1852860; Tolerance: ±20%; Voltage Rating: 25V; Temperature Coefficient: X7R; RoHS: Yes; ComponentLink1Description: Datasheet; ComponentLink1URL: https://wmsc.lcsc.com/wmsc/upload/file/pdf/v2/lcsc/2201271000_YAGEO-CC0402MRX7R8BB103_C1852860.pdf; ComponentLink2Description: JLCPCB Part URL; ComponentLink2URL: https://jlcpcb.com/partdetail/C1852860; ComponentLink3Description: LCSC Part URL; ComponentLink3URL: https://lcsc.com/product-detail/Multilayer-Ceramic-Capacitors-MLCC---SMD-SMT_YAGEO-YAGEO-CC0402MRX7R8BB103_C1852860.html
footprint CAP-0402 (0402 (1005M) Capacitor)
pins: 1, 2

## CC0402MRX7R9BB102
designator C?  Capacitance: 1nF  (hidden comment: *)
Capacitor, Ceramic (MLCC), 1nF, ±20%, 50V, X7R, ±20%, SMD 0402; Manufacturer: YAGEO; Manufacturer Part Number: CC0402MRX7R9BB102; Package Size: 0402; JLCPCB Basic Part: No; JLCPCB Part Number: C527029; Supplier 1: LCSC; Category: Capacitors - MLCC; Supplier Part Number 1: C527029; Tolerance: ±20%; Voltage Rating: 50V; Temperature Coefficient: X7R; RoHS: Yes; ComponentLink1Description: Datasheet; ComponentLink1URL: https://wmsc.lcsc.com/wmsc/upload/file/pdf/v2/lcsc/2005222139_YAGEO-CC0402MRX7R9BB102_C527029.pdf; ComponentLink2Description: JLCPCB Part URL; ComponentLink2URL: https://jlcpcb.com/partdetail/C527029; ComponentLink3Description: LCSC Part URL; ComponentLink3URL: https://lcsc.com/product-detail/Multilayer-Ceramic-Capacitors-MLCC---SMD-SMT_YAGEO-YAGEO-CC0402MRX7R9BB102_C527029.html
footprint CAP-0402 (0402 (1005M) Capacitor)
pins: 1, 2

## CC0402MRY5V6BB104
designator C?  Capacitance: 100nF  (hidden comment: *)
Capacitor, Ceramic (MLCC), 100nF, ±20%, 10V, Y5V, ±20%, SMD 0402; Manufacturer: YAGEO; Manufacturer Part Number: CC0402MRY5V6BB104; Package Size: 0402; JLCPCB Basic Part: No; JLCPCB Part Number: C527030; Supplier 1: LCSC; Category: Capacitors - MLCC; Supplier Part Number 1: C527030; Tolerance: ±20%; Voltage Rating: 10V; Temperature Coefficient: Y5V; RoHS: Yes; ComponentLink1Description: Datasheet; ComponentLink1URL: https://wmsc.lcsc.com/wmsc/upload/file/pdf/v2/lcsc/2006181534_YAGEO-CC0402MRY5V6BB104_C527030.pdf; ComponentLink2Description: JLCPCB Part URL; ComponentLink2URL: https://jlcpcb.com/partdetail/C527030; ComponentLink3Description: LCSC Part URL; ComponentLink3URL: https://lcsc.com/product-detail/Multilayer-Ceramic-Capacitors-MLCC---SMD-SMT_YAGEO-YAGEO-CC0402MRY5V6BB104_C527030.html
footprint CAP-0402 (0402 (1005M) Capacitor)
pins: 1, 2

## CC0402MRY5V6BB105
designator C?  Capacitance: 1uF  (hidden comment: *)
Capacitor, Ceramic (MLCC), 1uF, ±20%, 10V, Y5V, ±20%, SMD 0402; Manufacturer: YAGEO; Manufacturer Part Number: CC0402MRY5V6BB105; Package Size: 0402; JLCPCB Basic Part: No; JLCPCB Part Number: C527031; Supplier 1: LCSC; Category: Capacitors - MLCC; Supplier Part Number 1: C527031; Tolerance: ±20%; Voltage Rating: 10V; Temperature Coefficient: Y5V; RoHS: Yes; ComponentLink1Description: Datasheet; ComponentLink1URL: https://wmsc.lcsc.com/wmsc/upload/file/pdf/v2/lcsc/2007021836_YAGEO-CC0402MRY5V6BB105_C527031.pdf; ComponentLink2Description: JLCPCB Part URL; ComponentLink2URL: https://jlcpcb.com/partdetail/C527031; ComponentLink3Description: LCSC Part URL; ComponentLink3URL: https://lcsc.com/product-detail/Multilayer-Ceramic-Capacitors-MLCC---SMD-SMT_YAGEO-YAGEO-CC0402MRY5V6BB105_C527031.html
footprint CAP-0402 (0402 (1005M) Capacitor)
pins: 1, 2

## CC0402MRY5V7BB104
designator C?  Capacitance: 100nF  (hidden comment: *)
Capacitor, Ceramic (MLCC), 100nF, ±20%, 16V, Y5V, ±20%, SMD 0402; Manufacturer: YAGEO; Manufacturer Part Number: CC0402MRY5V7BB104; Package Size: 0402; JLCPCB Basic Part: No; JLCPCB Part Number: C327273; Supplier 1: LCSC; Category: Capacitors - MLCC; Supplier Part Number 1: C327273; Tolerance: ±20%; Voltage Rating: 16V; Temperature Coefficient: Y5V; RoHS: Yes; ComponentLink1Description: Datasheet; ComponentLink1URL: https://wmsc.lcsc.com/wmsc/upload/file/pdf/v2/lcsc/1811141242_YAGEO-CC0402MRY5V7BB104_C327273.pdf; ComponentLink2Description: JLCPCB Part URL; ComponentLink2URL: https://jlcpcb.com/partdetail/C327273; ComponentLink3Description: LCSC Part URL; ComponentLink3URL: https://lcsc.com/product-detail/Multilayer-Ceramic-Capacitors-MLCC---SMD-SMT_YAGEO-YAGEO-CC0402MRY5V7BB104_C327273.html
footprint CAP-0402 (0402 (1005M) Capacitor)
pins: 1, 2

## CC0402MRY5V8BB104
designator C?  Capacitance: 100nF  (hidden comment: *)
Capacitor, Ceramic (MLCC), 100nF, ±20%, 25V, Y5V, ±20%, SMD 0402; Manufacturer: YAGEO; Manufacturer Part Number: CC0402MRY5V8BB104; Package Size: 0402; JLCPCB Basic Part: No; JLCPCB Part Number: C327271; Supplier 1: LCSC; Category: Capacitors - MLCC; Supplier Part Number 1: C327271; Tolerance: ±20%; Voltage Rating: 25V; Temperature Coefficient: Y5V; RoHS: Yes; ComponentLink1Description: Datasheet; ComponentLink1URL: https://wmsc.lcsc.com/wmsc/upload/file/pdf/v2/lcsc/1811141243_YAGEO-CC0402MRY5V8BB104_C327271.pdf; ComponentLink2Description: JLCPCB Part URL; ComponentLink2URL: https://jlcpcb.com/partdetail/C327271; ComponentLink3Description: LCSC Part URL; ComponentLink3URL: https://lcsc.com/product-detail/Multilayer-Ceramic-Capacitors-MLCC---SMD-SMT_YAGEO-YAGEO-CC0402MRY5V8BB104_C327271.html
footprint CAP-0402 (0402 (1005M) Capacitor)
pins: 1, 2

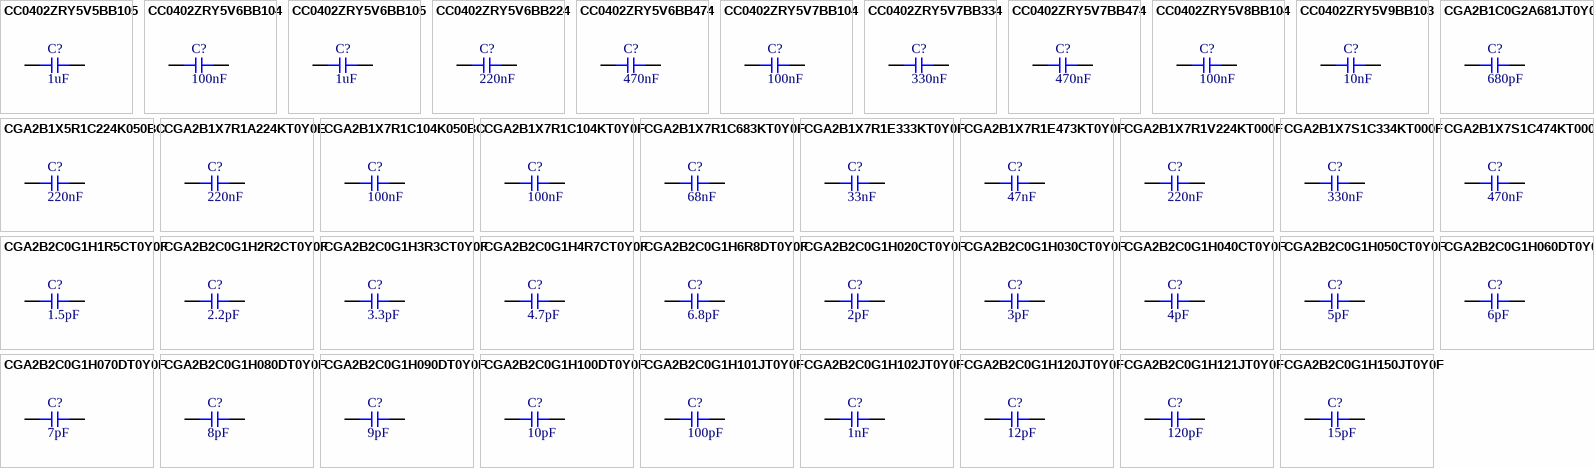
[diagram p42: symbols CC0402ZRY5V5BB105 to CGA2B2C0G1H150JT0Y0F]